# Altium footprint library Connectors.PcbLib: 120 footprints (part 1 of 8)
Each footprint in its own frame and in the unit in brackets; x right, y up, seen from the top. Pads: shape width x height; smd on the part's side, far side on the other; paste and mask are expansions set on the pad; w line width, h text height; cw(c..) or ccw(c..) is an arc to the next point about the centre after c.
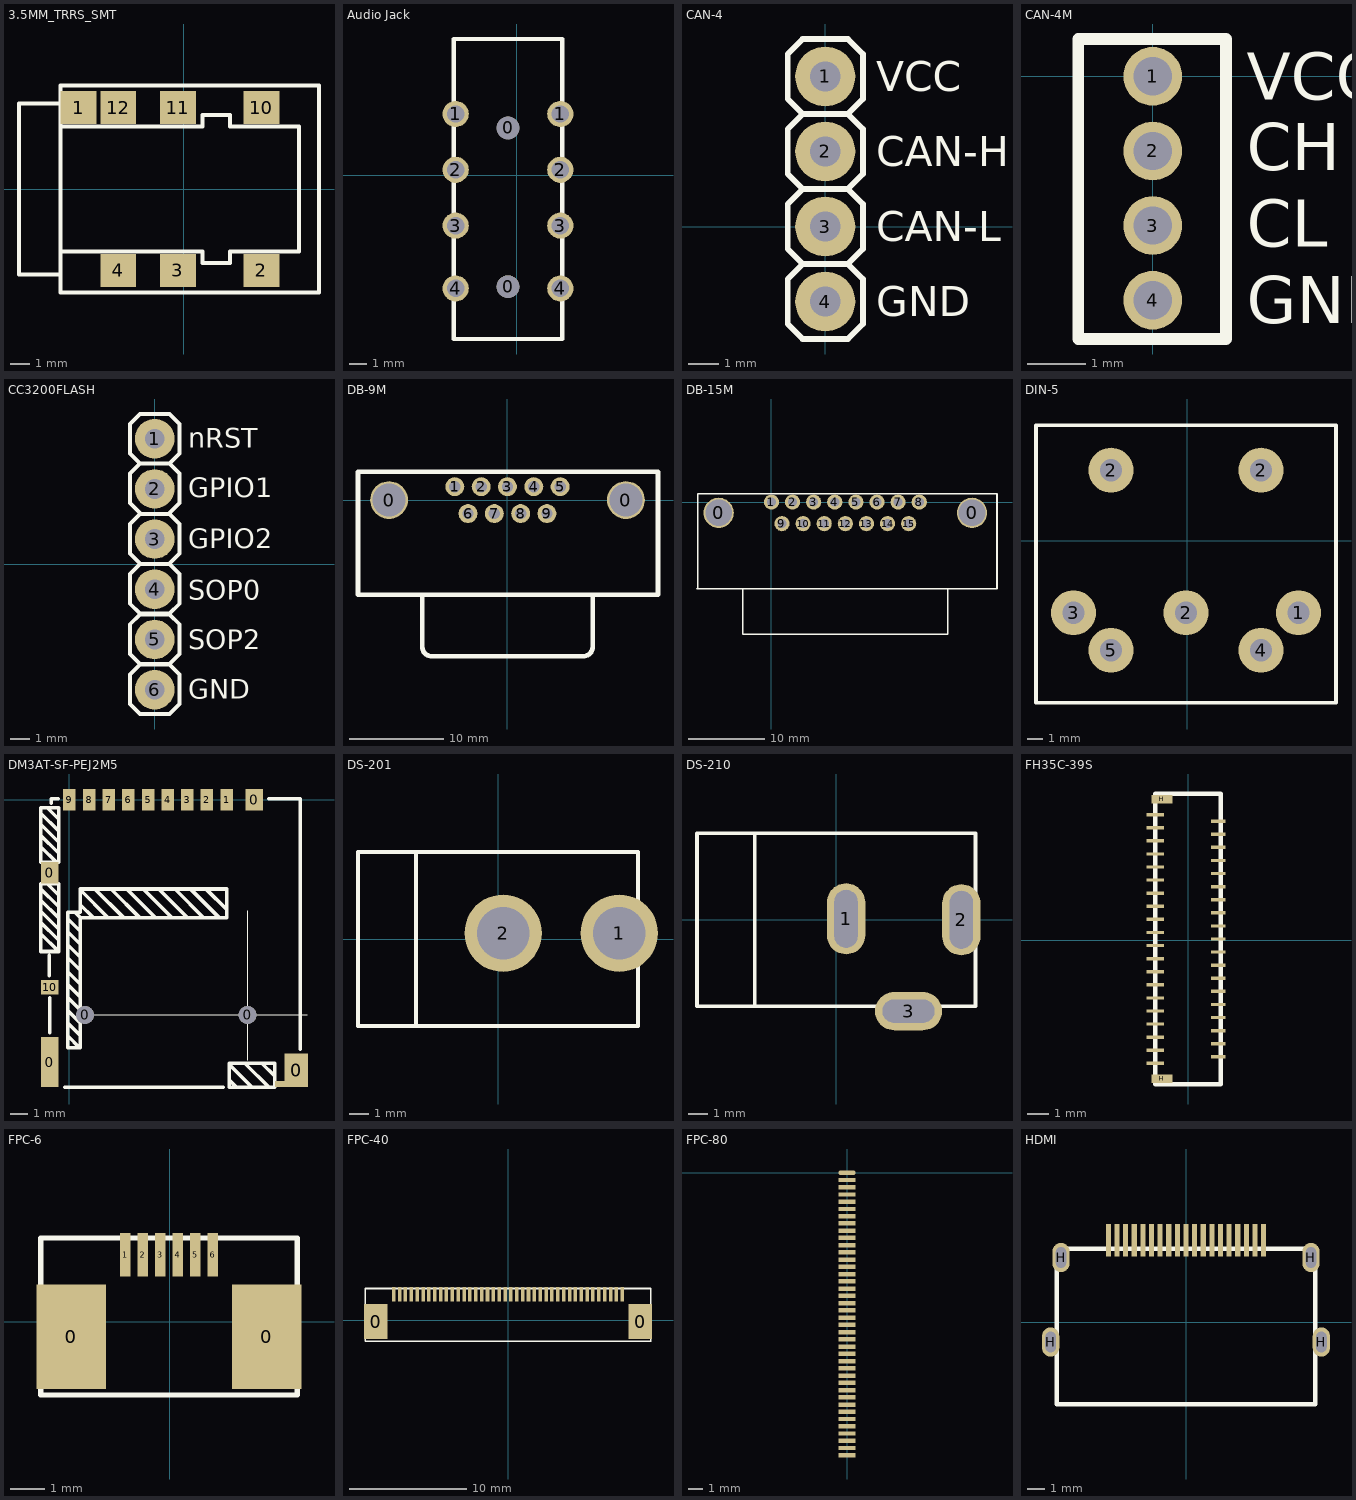
[diagram p0: the footprints below, top view; thin cyan lines are the x and y axes]

## 3.5MM_TRRS_SMT [mm] "SJ-4361 X-SMT-X"
pads (7):
  rect 1.8x1.65 smd paste+0 mask+0: 1(-5.3,4.1) 2(3.9,-4.1) 3(-0.3,-4.1) 4(-3.3,-4.1) 10(3.9,4.1) 11(-0.3,4.1) 12(-3.3,4.1)
Top Overlay:
  lines w0.2: -6.2,-4.3 -8.3,-4.3 -8.3,4.3 -6.2,4.3 ; -6.2,-3.15 0.925,-3.15 0.925,-3.725 2.325,-3.725 2.325,-3.15 5.8,-3.15 5.8,3.15 2.325,3.15 2.325,3.725 0.925,3.725 0.925,3.15 -6.2,3.15 ; -6.2,-5.2 6.8,-5.2 6.8,5.2 -6.2,5.2 -6.2,-5.2
3D body "sj-43614-smt.stp": height 3.9, standoff -1.8, extent -8.3,-4.3 5.7,4.3

## Audio Jack [mm] "4 pin"
pads (10):
  round 1.3 hole 1.3: 0(-0.5,-6.4) 0(-0.5,2.7)
  round 1.5 hole 1: 1(-3.5,3.5) 1(2.5,3.5) 2(-3.5,0.3) 2(2.5,0.3) 3(-3.5,-2.9) 3(2.5,-2.9) 4(-3.5,-6.5) 4(2.5,-6.5)
Top Overlay:
  lines w0.254: -3.6,-9.4 -3.6,7.8 2.6,7.8 2.6,-9.4 -3.6,-9.4
3D body "sj-3503-smt.stp": height 5.8, standoff -0.1, extent -4.8,-6.1 3.8,7.9

## CAN-4 [mm]
pads (4):
  round 2 hole 1: 1(0,5) 2(0,2.5) 3(0,0) 4(0,-2.5)
Top Overlay:
  lines w0.2: -0.75,-1.25 -1.25,-1.75 -1.25,-3.25 -0.75,-3.75 0.75,-3.75 1.25,-3.25 1.25,-1.75 0.75,-1.25 ; -0.75,-1.25 -1.25,-0.75 -1.25,0.75 -0.75,1.25 ; -0.75,-1.25 0.75,-1.25 ; -0.75,1.25 0.75,1.25 ; -0.75,1.25 -1.25,1.75 -1.25,3.25 -0.75,3.75 ; -0.75,3.75 -1.25,4.25 -1.25,5.75 -0.75,6.25 0.75,6.25 1.25,5.75 1.25,4.25 0.75,3.75 ; -0.75,3.75 0.75,3.75 ; 0.75,-1.25 1.25,-0.75 1.25,0.75 0.75,1.25 ; 0.75,1.25 1.25,1.75 1.25,3.25 0.75,3.75
  text "CAN-H" at 1.7,2 h1
  text "VCC" at 1.7,4.5 h1
  text "CAN-L" at 1.7,-0.5 h1
  text "GND" at 1.7,-3 h1
3D body "User Library-PLS-1.STEP": height 8.44, standoff -3, extent -1.27,3.73 1.27,6.27
3D body "User Library-PLS-1.STEP": height 8.44, standoff -3, extent -1.27,1.23 1.27,3.77
3D body "User Library-PLS-1.STEP": height 8.44, standoff -3, extent -1.27,-1.27 1.27,1.27
3D body "User Library-PLS-1.STEP": height 8.44, standoff -3, extent -1.27,-3.77 1.27,-1.23

## CAN-4M [mm]
pads (4):
  round 1 hole 0.65: 1(0,0) 2(0,-1.27) 3(0,-2.54) 4(0,-3.81)
Top Overlay:
  lines w0.2: -1.27,-4.47 1.245,-4.47 1.245,0.635 -1.27,0.635 -1.27,-4.47
  text "VCC" at 1.6,-0.4 h0.8
  text "CH" at 1.6,-1.6 h0.8
  text "CL" at 1.6,-2.9 h0.8
  text "GND" at 1.6,-4.2 h0.8
3D body "PLL-2.stp": height 5.2, standoff -2.9, extent -1.1,-4.64 1.1,-1.69
3D body "PLL-2.stp": height 5.2, standoff -2.9, extent -1.1,-2.1 1.1,0.85

## CC3200FLASH [mm]
pads (6):
  round 2 hole 1: 1(0,6.35) 2(0,3.81) 3(0,1.27) 4(0,-1.27) 5(0,-3.81) 6(0,-6.35)
Top Overlay:
  lines w0.2: -0.75,0.04 -1.25,0.54 -1.25,2.04 -0.75,2.54 0.75,2.54 1.25,2.04 1.25,0.54 0.75,0.04 ; -0.75,2.6 -1.25,3.1 -1.25,4.6 -0.75,5.1 ; 0.75,2.6 1.25,3.1 1.25,4.6 0.75,5.1 ; -0.75,5.1 -1.25,5.6 -1.25,7.1 -0.75,7.6 0.75,7.6 1.25,7.1 1.25,5.6 0.75,5.1 ; -0.75,5.1 0.75,5.1 ; -1.25,-7.08 -1.25,-5.58 -0.75,-5.08 0.75,-5.08 1.25,-5.58 1.25,-7.08 0.75,-7.58 -0.75,-7.58 -1.25,-7.08 ; -1.25,-4.54 -0.75,-5.04 0.75,-5.04 1.25,-4.54 1.25,-3.04 0.75,-2.54 -0.75,-2.54 -1.25,-3.04 -1.25,-4.54 ; -1.25,-2 -1.25,-0.5 -0.75,0 0.75,0 1.25,-0.5 1.25,-2 0.75,-2.5 -0.75,-2.5 -1.25,-2
  text "GND" at 1.7,-6.8 h1
  text "SOP2" at 1.7,-4.3 h1
  text "SOP0" at 1.7,-1.8 h1
  text "GPIO2" at 1.7,0.8 h1
  text "GPIO1" at 1.7,3.4 h1
  text "nRST" at 1.7,5.9 h1
3D body "User Library-PLS-1.STEP": height 8.44, standoff -3, extent -1.27,5.08 1.27,7.62
3D body "User Library-PLS-1.STEP": height 8.44, standoff -3, extent -1.27,2.54 1.27,5.08
3D body "User Library-PLS-1.STEP": height 8.44, standoff -3, extent -1.27,0 1.27,2.54
3D body "User Library-PLS-1.STEP": height 8.44, standoff -3, extent -1.27,-2.54 1.27,0
3D body "User Library-PLS-1.STEP": height 8.44, standoff -3, extent -1.27,-5.08 1.27,-2.54
3D body "User Library-PLS-1.STEP": height 8.44, standoff -3, extent -1.27,-7.62 1.27,-5.08

## DB-9M [mm]
pads (11):
  round 4 hole 3.5: 0(-12.51,0) 0(12.51,0)
  round 2 hole 1.2: 1(-5.56,1.42) 2(-2.78,1.42) 3(0,1.42) 4(2.78,1.42) 5(5.56,1.42) 6(-4.17,-1.42) 7(-1.39,-1.42) 8(1.39,-1.42) 9(4.17,-1.42)
Top Overlay:
  lines w0.508: -9,-10 -9,-15.5 ccw(c-8,-15.5) -8,-16.5 8,-16.5 ccw(c8,-15.5) 9,-15.5 9,-10 ; 15.89,3 15.89,-10 -15.79,-10 -15.79,3 15.9,3
3D body "SW3dPS-Connector DB-9-m PCB.STEP": height 12.42, standoff 0, extent -15.5,-16.536 15.6,2.75

## DB-15M [mm]
pads (17):
  round 4 hole 3.5: 0(-6.95,-1.42) 0(26.41,-1.42)
  round 2 hole 1.2: 1(0,0) 2(2.78,0) 3(5.56,0) 4(8.34,0) 5(11.12,0) 6(13.9,0) 7(16.68,0) 8(19.46,0) 9(1.39,-2.84) 10(4.17,-2.84) 11(6.95,-2.84) 12(9.73,-2.84) 13(12.51,-2.84) 14(15.29,-2.84) 15(18.07,-2.84)
Top Overlay:
  lines w0.2: -9.8,-11.4 29.7,-11.4 29.7,1.1 -9.7,1.1 -9.7,-11.4 ; -3.8,-11.4 -3.8,-17.4 23.2,-17.4 23.2,-11.4
3D body "SW3dPS-DB-15-f.STEP": height 12.42, standoff 0, extent -9.72,-17.94 29.7,1.05

## DIN-5 [mm]
pads (7):
  round 3 hole 1.5: 1(7.4,-4.8) 2(-5.1,4.7) 2(-0.1,-4.8) 2(4.9,4.7) 3(-7.6,-4.8) 4(4.9,-7.3) 5(-5.1,-7.3)
Top Overlay:
  lines w0.254: -10.1,-10.8 9.9,-10.8 9.9,7.7 -10.1,7.7 -10.1,-10.8
3D body "DIN-5_1.step": height 21.1, standoff -3.5, extent -10.05,-10.8 9.95,7.7

## DM3AT-SF-PEJ2M5 [mm] "microSD card socket"
pads (17):
  rect 1x2.8 smd: 0(-1.1,-14.7)
  rect 1x1.2 smd: 0(-1.1,-4.1) 0(10.35,0)
  round 1 hole 1 unplated paste+0 mask+0.102: 0(0.875,-12.05) 0(9.975,-12.05)
  rect 0.55x0.35 smd: 0(11.775,-15.925)
  rect 1.3x1.9 smd: 0(12.7,-15.15)
  rect 0.7x1.2 smd: 1(8.8,0) 2(7.7,0) 3(6.6,0) 4(5.5,0) 5(4.4,0) 6(3.3,0) 7(2.2,0) 8(1.1,0) 9(0,0)
  rect 1x0.8 smd: 10(-1.1,-10.5)
Top Overlay:
  lines w0.01: 0.875,-12.05 1.725,-12.05 13.325,-12.05 ; 9.975,-14.6 9.975,-6.225
  lines w0.2: -1.6,-7.5 -0.625,-8.475 ; -1.6,-6.875 -0.625,-7.85 ; -1.6,-6.25 -0.625,-7.225 ; -1.6,-5.625 -0.625,-6.6 ; -1.6,-5 -0.625,-5.975 ; -1.6,-2.625 -0.725,-3.5 ; -1.6,-2 -0.625,-2.975 ; -1.6,-1.375 -0.625,-2.35 ; -1.6,-0.75 -0.625,-1.725 ; -1.575,-4.7 -1.6,-4.7 ; -1.25,-4.7 -0.6,-5.35 ; -1.25,-0.45 -0.6,-1.1 ; -1.125,-9.85 -1.125,-8.7 ; -1.1,-13.05 -1.1,-11.1 ; -1.025,-0.2 -1.025,0.05 -0.625,0.05 ; -0.6,-3.5 -0.6,-0.45 -1.6,-0.45 -1.6,-3.5 -0.725,-3.5 ; -0.275,-16.1 8.6,-16.1 ; -0.1,-13.225 0.575,-13.9 0.6,-13.9 ; -0.1,-12.5 0.6,-13.2 ; -0.1,-11.8 0.6,-12.5 ; -0.1,-11.075 0.6,-11.775 ; -0.1,-10.35 0.6,-11.05 ; -0.1,-9.625 0.6,-10.325 ; -0.1,-8.85 0.6,-9.55 ; -0.1,-8.125 0.6,-8.825 ; -0.1,-7.375 -0.1,-7.4 0.6,-8.1 ; -0.1,-6.625 -0.1,-6.675 0.6,-7.375 ; 0.25,-6.3 0.3,-6.3 0.6,-6.6 ; 1.325,-6.6 0.6,-5.875 ; 1.375,-5 1.425,-5 3.025,-6.6 ; 2.15,-6.6 0.6,-5.05 0.6,-5 ; 2.375,-5.05 3.925,-6.6 ; 3.2,-5 4.8,-6.6 ; 4.175,-5.05 5.725,-6.6 ; 5,-5 6.6,-6.6 ; 5.95,-5.05 7.5,-6.6 ; 6.775,-5 8.375,-6.6 ; 7.65,-5 8.8,-6.15 ; 8.95,-15.675 8.95,-15.7 9.325,-16.075 ; 9.775,-14.75 9.825,-14.75 11.175,-16.1 ; 10.225,-16.1 8.95,-14.825 8.95,-14.75 ; 10.725,-14.75 10.775,-14.75 11.5,-15.475 ; 11.15,0.05 12.925,0.05 12.925,-13.975 ; -1.6,-4.7 -1.6,-8.5 -0.6,-8.5 -0.6,-4.7 -1.6,-4.7 ; -0.725,-3.5 -0.725,-3.5 ; 0.6,-13.9 0.6,-6.6 ; 0.6,-13.9 -0.1,-13.9 -0.1,-6.3 0.6,-6.3 0.6,-5 ; 0.6,-6.6 8.8,-6.6 8.8,-5 0.6,-5 ; 0.6,-5.875 0.6,-5.875 ; 8.95,-14.75 8.95,-16.1 11.5,-16.1 11.5,-14.75 8.95,-14.75
3D body "DM3AT-SF-PEJ2M5.stp": height 1.68, standoff -0.5, extent -0.925,-16.1 12.925,0.05

## DS-201 [mm]
pads (2):
  round 4 hole 2.7: 1(6.25,0.3) 2(0.25,0.3)
Top Overlay:
  lines w0.2: -4.25,-4.5 -4.25,4.5 -7.25,4.5 ; -7.25,4.5 7.225,4.5 7.225,-4.5 -7.25,-4.5 -7.25,4.5 ; 3.75,-4.5 3.75,-4.5
3D body "User Library-ds-210.STEP": height 11.1, standoff -4.3, extent -7.25,-5.05 7.25,4.5

## DS-210 [mm] "DS-210 power connector"
pads (3):
  oval 2x3.7 hole 1.2 slot 3 at 90 deg: 1(0.5,0.05) 2(6.5,0)
  oval 3.5x2 hole 1.2 slot 2.7 at 0 deg: 3(3.75,-4.75)
Top Overlay:
  lines w0.2: -4.25,-4.5 -4.25,4.5 -7.25,4.5 ; -7.25,4.5 7.225,4.5 7.225,-4.5 -7.25,-4.5 -7.25,4.5 ; 3.75,-4.5 3.75,-4.5
3D body "User Library-ds-210.STEP": height 11.1, standoff -4.3, extent -7.25,-5.05 7.25,4.5

## FH35C-39S [mm]
pads (41):
  rect 0.8x0.15 smd: 1(-1.5,5.75) 3(-1.5,5.15) 5(-1.5,4.55) 7(-1.5,3.95) 9(-1.5,3.35) 11(-1.5,2.75) 13(-1.5,2.15) 15(-1.5,1.55) 17(-1.5,0.95) 19(-1.5,0.35) 21(-1.5,-0.25) 23(-1.5,-0.85) 25(-1.5,-1.45) 27(-1.5,-2.05) 29(-1.5,-2.65) 31(-1.5,-3.25) 33(-1.5,-3.85) 35(-1.5,-4.45) 37(-1.5,-5.05) 39(-1.5,-5.65)
  rect 0.65x0.15 smd: 2(1.38,5.45) 4(1.38,4.85) 6(1.38,4.25) 8(1.38,3.65) 10(1.38,3.05) 12(1.38,2.45) 14(1.38,1.85) 16(1.38,1.25) 18(1.38,0.65) 20(1.38,0.05) 22(1.38,-0.55) 24(1.38,-1.15) 26(1.38,-1.75) 28(1.38,-2.35) 30(1.38,-2.95) 32(1.38,-3.55) 34(1.38,-4.15) 36(1.38,-4.75) 38(1.38,-5.35)
  rect 0.95x0.4 smd: H(-1.2,-6.35) H(-1.2,6.45)
Top Overlay:
  lines w0.2: -1.5,-6.6 1.5,-6.6 1.5,6.7 -1.5,6.7 -1.5,-6.6
3D body "10061122391320hlf.stp": height 0.9, standoff 0, extent -2,-6.75 1.5,6.75

## FPC-6 [mm]
pads (8):
  rect 2x3 smd: 0(-2.825,-0.425) 0(2.775,-0.425)
  rect 0.3x1.25 smd: 1(-1.275,1.925) 2(-0.775,1.925) 3(-0.275,1.925) 4(0.225,1.925) 5(0.725,1.925) 6(1.225,1.925)
Top Overlay:
  lines w0.15: -3.7,2.4 3.65,2.4 3.65,-2.1 -3.7,-2.1 -3.7,2.4 ; -3.7,2.4 -3.7,2.4
3D body "31826.stp": height 1.03, standoff 0.03, extent -2.525,-1.4 2.475,2.4

## FPC-40 [mm]
pads (42):
  rect 2x3 smd: 0(-11.325,-0.1) 0(11.275,-0.1)
  rect 0.3x1.25 smd: 1(-9.775,2.25) 2(-9.275,2.25) 3(-8.775,2.25) 4(-8.275,2.25) 5(-7.775,2.25) 6(-7.275,2.25) 7(-6.775,2.25) 8(-6.275,2.25) 9(-5.775,2.25) 10(-5.275,2.25) 11(-4.775,2.25) 12(-4.275,2.25) 13(-3.775,2.25) 14(-3.275,2.25) 15(-2.775,2.25) 16(-2.275,2.25) 17(-1.775,2.25) 18(-1.275,2.25) 19(-0.775,2.25) 20(-0.275,2.25) 21(0.225,2.25) 22(0.725,2.25) 23(1.225,2.25) 24(1.725,2.25) 25(2.225,2.25) 26(2.725,2.25) 27(3.225,2.25) 28(3.725,2.25) 29(4.225,2.25) 30(4.725,2.25) 31(5.225,2.25) 32(5.725,2.25) 33(6.225,2.25) 34(6.725,2.25) 35(7.225,2.25) 36(7.725,2.25) 37(8.225,2.25) 38(8.725,2.25) 39(9.225,2.25) 40(9.725,2.25)
Top Overlay:
  lines w0.15: -12.2,2.725 12.15,2.725 12.15,-1.775 ; -12.2,2.725 -12.2,-1.775 12.15,-1.775 ; -12.2,2.725 -12.2,2.725 ; 12.15,-1.775 12.15,-1.775
3D body "31805.stp": height 2.5, standoff -0.05, extent -12.5,-4.35 12.4,2.85

## FPC-80 [mm]
pads (40):
  oval 1.2x0.3 smd: 1(0,0)
  rect 1.2x0.3 smd: 2(0,-0.5) 3(0,-1) 4(0,-1.5) 5(0,-2) 6(0,-2.5) 7(0,-3) 8(0,-3.5) 9(0,-4) 10(0,-4.5) 11(0,-5) 12(0,-5.5) 13(0,-6) 14(0,-6.5) 15(0,-7) 16(0,-7.5) 17(0,-8) 18(0,-8.5) 19(0,-9) 20(0,-9.5) 21(0,-10) 22(0,-10.5) 23(0,-11) 24(0,-11.5) 25(0,-12) 26(0,-12.5) 27(0,-13) 28(0,-13.5) 29(0,-14) 30(0,-14.5) 31(0,-15) 32(0,-15.5) 33(0,-16) 34(0,-16.5) 35(0,-17) 36(0,-17.5) 37(0,-18) 38(0,-18.5) 39(0,-19) 40(0,-19.5)

## HDMI [mm]
pads (23):
  rect 0.3x1.9 smd: 1(4.5,4.75) 2(4,4.75) 3(3.5,4.75) 4(3,4.75) 5(2.5,4.75) 6(2,4.75) 7(1.5,4.75) 8(1,4.75) 9(0.5,4.75) 10(0,4.75) 11(-0.5,4.75) 12(-1,4.75) 13(-1.5,4.75) 14(-2,4.75) 15(-2.5,4.75) 16(-3,4.75) 17(-3.5,4.75) 18(-4,4.75) 19(-4.5,4.75)
  oval 1x1.7 hole 0.6 slot 1.2 at 90 deg: H(-7.85,-1.15) H(-7.25,3.75) H(7.25,3.75) H(7.85,-1.15)
Top Overlay:
  lines w0.254: -7.5,-4.75 -7.5,4.25 7.5,4.25 7.5,-4.75 -7.5,-4.75
3D body "HDMI.STEP": height 6.08, standoff -1.92, extent -8.1,-4.7 8.1,5.2